# Altium footprint library Connector_Samtec_HLE_SMD.PcbLib: 290 footprints (part 22 of 24)
Each footprint in its own frame and in the unit in brackets; x right, y up, seen from the top. Pads: shape width x height; smd on the part's side, far side on the other; paste and mask are expansions set on the pad; w line width, h text height; cw(c..) or ccw(c..) is an arc to the next point about the centre after c.
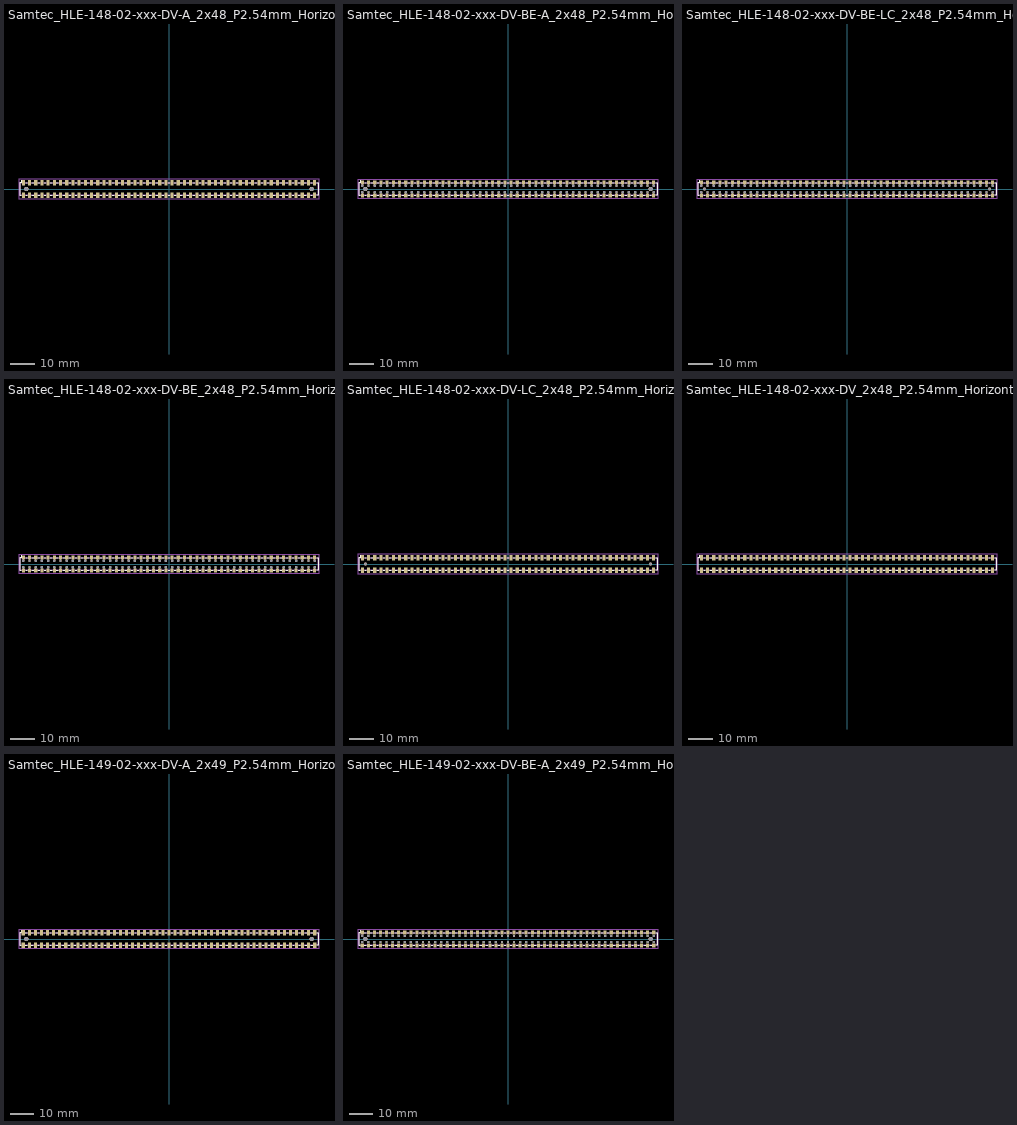
[diagram p21: the footprints below, top view; thin cyan lines are the x and y axes]

## Samtec_HLE-148-02-xxx-DV-A_2x48_P2.54mm_Horizontal [mm]
pads (98):
  rect 1.27x2.29 smd: 1(-59.69,2.525) 2(-59.69,-2.525) 3(-57.15,2.525) 4(-57.15,-2.525) 5(-54.61,2.525) 6(-54.61,-2.525) 7(-52.07,2.525) 8(-52.07,-2.525) 9(-49.53,2.525) 10(-49.53,-2.525) 11(-46.99,2.525) 12(-46.99,-2.525) 13(-44.45,2.525) 14(-44.45,-2.525) 15(-41.91,2.525) 16(-41.91,-2.525) 17(-39.37,2.525) 18(-39.37,-2.525) 19(-36.83,2.525) 20(-36.83,-2.525) 21(-34.29,2.525) 22(-34.29,-2.525) 23(-31.75,2.525) 24(-31.75,-2.525) 25(-29.21,2.525) 26(-29.21,-2.525) 27(-26.67,2.525) 28(-26.67,-2.525) 29(-24.13,2.525) 30(-24.13,-2.525) 31(-21.59,2.525) 32(-21.59,-2.525) 33(-19.05,2.525) 34(-19.05,-2.525) 35(-16.51,2.525) 36(-16.51,-2.525) 37(-13.97,2.525) 38(-13.97,-2.525) 39(-11.43,2.525) 40(-11.43,-2.525) 41(-8.89,2.525) 42(-8.89,-2.525) 43(-6.35,2.525) 44(-6.35,-2.525) 45(-3.81,2.525) 46(-3.81,-2.525) 47(-1.27,2.525) 48(-1.27,-2.525) 49(1.27,2.525) 50(1.27,-2.525) 51(3.81,2.525) 52(3.81,-2.525) 53(6.35,2.525) 54(6.35,-2.525) 55(8.89,2.525) 56(8.89,-2.525) 57(11.43,2.525) 58(11.43,-2.525) 59(13.97,2.525) 60(13.97,-2.525) 61(16.51,2.525) 62(16.51,-2.525) 63(19.05,2.525) 64(19.05,-2.525) 65(21.59,2.525) 66(21.59,-2.525) 67(24.13,2.525) 68(24.13,-2.525) 69(26.67,2.525) 70(26.67,-2.525) 71(29.21,2.525) 72(29.21,-2.525) 73(31.75,2.525) 74(31.75,-2.525) 75(34.29,2.525) 76(34.29,-2.525) 77(36.83,2.525) 78(36.83,-2.525) 79(39.37,2.525) 80(39.37,-2.525) 81(41.91,2.525) 82(41.91,-2.525) 83(44.45,2.525) 84(44.45,-2.525) 85(46.99,2.525) 86(46.99,-2.525) 87(49.53,2.525) 88(49.53,-2.525) 89(52.07,2.525) 90(52.07,-2.525) 91(54.61,2.525) 92(54.61,-2.525) 93(57.15,2.525) 94(57.15,-2.525) 95(59.69,2.525) 96(59.69,-2.525)
  round 1.78 hole 1.78: Un1(58.42,0) Un2(-58.42,0)
F.SilkS:
  lines w0.12: -60.585,-2.65 -61.07,-2.65 -61.07,2.65 -60.585,2.65 -60.585,3.67 ; -58.795,-2.65 -58.045,-2.65 ; -58.795,2.65 -58.045,2.65 ; -56.255,-2.65 -55.505,-2.65 ; -56.255,2.65 -55.505,2.65 ; -53.715,-2.65 -52.965,-2.65 ; -53.715,2.65 -52.965,2.65 ; -51.175,-2.65 -50.425,-2.65 ; -51.175,2.65 -50.425,2.65 ; -48.635,-2.65 -47.885,-2.65 ; -48.635,2.65 -47.885,2.65 ; -46.095,-2.65 -45.345,-2.65 ; -46.095,2.65 -45.345,2.65 ; -43.555,-2.65 -42.805,-2.65 ; -43.555,2.65 -42.805,2.65 ; -41.015,-2.65 -40.265,-2.65 ; -41.015,2.65 -40.265,2.65 ; -38.475,-2.65 -37.725,-2.65 ; -38.475,2.65 -37.725,2.65 ; -35.935,-2.65 -35.185,-2.65 ; -35.935,2.65 -35.185,2.65 ; -33.395,-2.65 -32.645,-2.65 ; -33.395,2.65 -32.645,2.65 ; -30.855,-2.65 -30.105,-2.65 ; -30.855,2.65 -30.105,2.65 ; -28.315,-2.65 -27.565,-2.65 ; -28.315,2.65 -27.565,2.65 ; -25.775,-2.65 -25.025,-2.65 ; -25.775,2.65 -25.025,2.65 ; -23.235,-2.65 -22.485,-2.65 ; -23.235,2.65 -22.485,2.65 ; -20.695,-2.65 -19.945,-2.65 ; -20.695,2.65 -19.945,2.65 ; -18.155,-2.65 -17.405,-2.65 ; -18.155,2.65 -17.405,2.65 ; -15.615,-2.65 -14.865,-2.65 ; -15.615,2.65 -14.865,2.65 ; -13.075,-2.65 -12.325,-2.65 ; -13.075,2.65 -12.325,2.65 ; -10.535,-2.65 -9.785,-2.65 ; -10.535,2.65 -9.785,2.65 ; -7.995,-2.65 -7.245,-2.65 ; -7.995,2.65 -7.245,2.65 ; -5.455,-2.65 -4.705,-2.65 ; -5.455,2.65 -4.705,2.65 ; -2.915,-2.65 -2.165,-2.65 ; -2.915,2.65 -2.165,2.65 ; -0.375,-2.65 0.375,-2.65 ; -0.375,2.65 0.375,2.65 ; 2.165,-2.65 2.915,-2.65 ; 2.165,2.65 2.915,2.65 ; 4.705,-2.65 5.455,-2.65 ; 4.705,2.65 5.455,2.65 ; 7.245,-2.65 7.995,-2.65 ; 7.245,2.65 7.995,2.65 ; 9.785,-2.65 10.535,-2.65 ; 9.785,2.65 10.535,2.65 ; 12.325,-2.65 13.075,-2.65 ; 12.325,2.65 13.075,2.65 ; 14.865,-2.65 15.615,-2.65 ; 14.865,2.65 15.615,2.65 ; 17.405,-2.65 18.155,-2.65 ; 17.405,2.65 18.155,2.65 ; 19.945,-2.65 20.695,-2.65 ; 19.945,2.65 20.695,2.65 ; 22.485,-2.65 23.235,-2.65 ; 22.485,2.65 23.235,2.65 ; 25.025,-2.65 25.775,-2.65 ; 25.025,2.65 25.775,2.65 ; 27.565,-2.65 28.315,-2.65 ; 27.565,2.65 28.315,2.65 ; 30.105,-2.65 30.855,-2.65 ; 30.105,2.65 30.855,2.65 ; 32.645,-2.65 33.395,-2.65 ; 32.645,2.65 33.395,2.65 ; 35.185,-2.65 35.935,-2.65 ; 35.185,2.65 35.935,2.65 ; 37.725,-2.65 38.475,-2.65 ; 37.725,2.65 38.475,2.65 ; 40.265,-2.65 41.015,-2.65 ; 40.265,2.65 41.015,2.65 ; 42.805,-2.65 43.555,-2.65 ; 42.805,2.65 43.555,2.65 ; 45.345,-2.65 46.095,-2.65 ; 45.345,2.65 46.095,2.65 ; 47.885,-2.65 48.635,-2.65 ; 47.885,2.65 48.635,2.65 ; 50.425,-2.65 51.175,-2.65 ; 50.425,2.65 51.175,2.65 ; 52.965,-2.65 53.715,-2.65 ; 52.965,2.65 53.715,2.65 ; 55.505,-2.65 56.255,-2.65 ; 55.505,2.65 56.255,2.65 ; 58.045,-2.65 58.795,-2.65 ; 58.045,2.65 58.795,2.65 ; 60.585,-2.65 61.07,-2.65 61.07,2.65 60.585,2.65
F.CrtYd:
  lines w0.05: -61.46,-4.17 61.46,-4.17 61.46,4.17 -61.46,4.17 -61.46,-4.17
F.Fab:
  lines w0.1: -60.19,2.54 -59.69,1.833 -59.19,2.54 ; -60.96,-2.54 -60.96,2.54 60.96,2.54 60.96,-2.54 -60.96,-2.54
  text "'.Designator'" at -4.047,-2.68 h1

## Samtec_HLE-148-02-xxx-DV-BE-A_2x48_P2.54mm_Horizontal [mm]
pads (194):
  rect 1.27x1.68 smd: 1(-59.69,2.72) 2(-59.69,-2.72) 3(-57.15,2.72) 4(-57.15,-2.72) 5(-54.61,2.72) 6(-54.61,-2.72) 7(-52.07,2.72) 8(-52.07,-2.72) 9(-49.53,2.72) 10(-49.53,-2.72) 11(-46.99,2.72) 12(-46.99,-2.72) 13(-44.45,2.72) 14(-44.45,-2.72) 15(-41.91,2.72) 16(-41.91,-2.72) 17(-39.37,2.72) 18(-39.37,-2.72) 19(-36.83,2.72) 20(-36.83,-2.72) 21(-34.29,2.72) 22(-34.29,-2.72) 23(-31.75,2.72) 24(-31.75,-2.72) 25(-29.21,2.72) 26(-29.21,-2.72) 27(-26.67,2.72) 28(-26.67,-2.72) 29(-24.13,2.72) 30(-24.13,-2.72) 31(-21.59,2.72) 32(-21.59,-2.72) 33(-19.05,2.72) 34(-19.05,-2.72) 35(-16.51,2.72) 36(-16.51,-2.72) 37(-13.97,2.72) 38(-13.97,-2.72) 39(-11.43,2.72) 40(-11.43,-2.72) 41(-8.89,2.72) 42(-8.89,-2.72) 43(-6.35,2.72) 44(-6.35,-2.72) 45(-3.81,2.72) 46(-3.81,-2.72) 47(-1.27,2.72) 48(-1.27,-2.72) 49(1.27,2.72) 50(1.27,-2.72) 51(3.81,2.72) 52(3.81,-2.72) 53(6.35,2.72) 54(6.35,-2.72) 55(8.89,2.72) 56(8.89,-2.72) 57(11.43,2.72) 58(11.43,-2.72) 59(13.97,2.72) 60(13.97,-2.72) 61(16.51,2.72) 62(16.51,-2.72) 63(19.05,2.72) 64(19.05,-2.72) 65(21.59,2.72) 66(21.59,-2.72) 67(24.13,2.72) 68(24.13,-2.72) 69(26.67,2.72) 70(26.67,-2.72) 71(29.21,2.72) 72(29.21,-2.72) 73(31.75,2.72) 74(31.75,-2.72) 75(34.29,2.72) 76(34.29,-2.72) 77(36.83,2.72) 78(36.83,-2.72) 79(39.37,2.72) 80(39.37,-2.72) 81(41.91,2.72) 82(41.91,-2.72) 83(44.45,2.72) 84(44.45,-2.72) 85(46.99,2.72) 86(46.99,-2.72) 87(49.53,2.72) 88(49.53,-2.72) 89(52.07,2.72) 90(52.07,-2.72) 91(54.61,2.72) 92(54.61,-2.72) 93(57.15,2.72) 94(57.15,-2.72) 95(59.69,2.72) 96(59.69,-2.72)
  round 0.97 hole 0.97: Un1(-24.13,1.27) Un2(-13.97,-1.27) Un3(-11.43,-1.27) Un4(-36.83,1.27) Un5(31.75,1.27) Un6(8.89,1.27) Un7(44.45,1.27) Un8(-31.75,-1.27) Un9(13.97,-1.27) Un10(31.75,-1.27) Un11(-8.89,-1.27) Un12(49.53,-1.27) Un13(16.51,-1.27) Un14(-44.45,1.27) Un15(41.91,-1.27) Un16(-24.13,-1.27) Un17(-8.89,1.27) Un18(24.13,-1.27) Un19(36.83,1.27) Un20(-16.51,1.27) Un21(-49.53,-1.27) Un22(13.97,1.27) Un23(8.89,-1.27) Un24(-19.05,1.27) Un25(-39.37,1.27) Un26(-59.69,-1.27) Un27(-41.91,-1.27) Un28(-52.07,1.27) Un29(44.45,-1.27) Un30(-46.99,-1.27) Un31(-46.99,1.27) Un32(59.69,-1.27) Un33(-3.81,-1.27) Un34(-3.81,1.27) Un35(11.43,-1.27) Un36(-31.75,1.27) Un37(3.81,-1.27) Un38(16.51,1.27) Un40(46.99,1.27) Un41(36.83,-1.27) Un42(59.69,1.27) Un43(-6.35,-1.27) Un44(49.53,1.27) Un45(-6.35,1.27) Un46(3.81,1.27) Un47(-49.53,1.27) Un48(29.21,-1.27) Un49(-41.91,1.27) Un50(-26.67,1.27) Un51(52.07,-1.27) Un52(21.59,1.27) Un53(57.15,1.27) Un54(-16.51,-1.27) Un55(-34.29,1.27) Un56(21.59,-1.27) Un57(-34.29,-1.27) Un58(26.67,-1.27) Un59(-59.69,1.27) Un60(19.05,-1.27) Un61(1.27,1.27) Un62(57.15,-1.27) Un63(-52.07,-1.27) Un64(-29.21,-1.27) Un65(-57.15,1.27) Un66(34.29,-1.27) Un67(-21.59,1.27) Un68(1.27,-1.27) Un69(-1.27,-1.27) Un70(54.61,1.27) Un71(-1.27,1.27) Un72(-44.45,-1.27) Un73(-19.05,-1.27) Un74(-29.21,1.27) Un75(39.37,1.27) Un76(-54.61,-1.27) Un77(-13.97,1.27) Un78(26.67,1.27) Un79(-26.67,-1.27) Un80(41.91,1.27) Un81(52.07,1.27) Un82(46.99,-1.27) Un83(29.21,1.27) Un84(6.35,-1.27) Un85(-36.83,-1.27) Un86(6.35,1.27) Un87(-39.37,-1.27) Un88(-57.15,-1.27) Un89(-21.59,-1.27) Un90(39.37,-1.27) Un92(-54.61,1.27) Un93(24.13,1.27) Un94(11.43,1.27) Un95(19.05,1.27) Un96(54.61,-1.27) Un97(34.29,1.27) Un98(-11.43,1.27)
  round 1.78 hole 1.78: Un39(-58.42,0) Un91(58.42,0)
F.SilkS:
  lines w0.12: -60.585,-2.65 -61.07,-2.65 -61.07,2.65 -60.585,2.65 -60.585,3.56 ; -58.795,-2.65 -58.045,-2.65 ; -58.795,2.65 -58.045,2.65 ; -56.255,-2.65 -55.505,-2.65 ; -56.255,2.65 -55.505,2.65 ; -53.715,-2.65 -52.965,-2.65 ; -53.715,2.65 -52.965,2.65 ; -51.175,-2.65 -50.425,-2.65 ; -51.175,2.65 -50.425,2.65 ; -48.635,-2.65 -47.885,-2.65 ; -48.635,2.65 -47.885,2.65 ; -46.095,-2.65 -45.345,-2.65 ; -46.095,2.65 -45.345,2.65 ; -43.555,-2.65 -42.805,-2.65 ; -43.555,2.65 -42.805,2.65 ; -41.015,-2.65 -40.265,-2.65 ; -41.015,2.65 -40.265,2.65 ; -38.475,-2.65 -37.725,-2.65 ; -38.475,2.65 -37.725,2.65 ; -35.935,-2.65 -35.185,-2.65 ; -35.935,2.65 -35.185,2.65 ; -33.395,-2.65 -32.645,-2.65 ; -33.395,2.65 -32.645,2.65 ; -30.855,-2.65 -30.105,-2.65 ; -30.855,2.65 -30.105,2.65 ; -28.315,-2.65 -27.565,-2.65 ; -28.315,2.65 -27.565,2.65 ; -25.775,-2.65 -25.025,-2.65 ; -25.775,2.65 -25.025,2.65 ; -23.235,-2.65 -22.485,-2.65 ; -23.235,2.65 -22.485,2.65 ; -20.695,-2.65 -19.945,-2.65 ; -20.695,2.65 -19.945,2.65 ; -18.155,-2.65 -17.405,-2.65 ; -18.155,2.65 -17.405,2.65 ; -15.615,-2.65 -14.865,-2.65 ; -15.615,2.65 -14.865,2.65 ; -13.075,-2.65 -12.325,-2.65 ; -13.075,2.65 -12.325,2.65 ; -10.535,-2.65 -9.785,-2.65 ; -10.535,2.65 -9.785,2.65 ; -7.995,-2.65 -7.245,-2.65 ; -7.995,2.65 -7.245,2.65 ; -5.455,-2.65 -4.705,-2.65 ; -5.455,2.65 -4.705,2.65 ; -2.915,-2.65 -2.165,-2.65 ; -2.915,2.65 -2.165,2.65 ; -0.375,-2.65 0.375,-2.65 ; -0.375,2.65 0.375,2.65 ; 2.165,-2.65 2.915,-2.65 ; 2.165,2.65 2.915,2.65 ; 4.705,-2.65 5.455,-2.65 ; 4.705,2.65 5.455,2.65 ; 7.245,-2.65 7.995,-2.65 ; 7.245,2.65 7.995,2.65 ; 9.785,-2.65 10.535,-2.65 ; 9.785,2.65 10.535,2.65 ; 12.325,-2.65 13.075,-2.65 ; 12.325,2.65 13.075,2.65 ; 14.865,-2.65 15.615,-2.65 ; 14.865,2.65 15.615,2.65 ; 17.405,-2.65 18.155,-2.65 ; 17.405,2.65 18.155,2.65 ; 19.945,-2.65 20.695,-2.65 ; 19.945,2.65 20.695,2.65 ; 22.485,-2.65 23.235,-2.65 ; 22.485,2.65 23.235,2.65 ; 25.025,-2.65 25.775,-2.65 ; 25.025,2.65 25.775,2.65 ; 27.565,-2.65 28.315,-2.65 ; 27.565,2.65 28.315,2.65 ; 30.105,-2.65 30.855,-2.65 ; 30.105,2.65 30.855,2.65 ; 32.645,-2.65 33.395,-2.65 ; 32.645,2.65 33.395,2.65 ; 35.185,-2.65 35.935,-2.65 ; 35.185,2.65 35.935,2.65 ; 37.725,-2.65 38.475,-2.65 ; 37.725,2.65 38.475,2.65 ; 40.265,-2.65 41.015,-2.65 ; 40.265,2.65 41.015,2.65 ; 42.805,-2.65 43.555,-2.65 ; 42.805,2.65 43.555,2.65 ; 45.345,-2.65 46.095,-2.65 ; 45.345,2.65 46.095,2.65 ; 47.885,-2.65 48.635,-2.65 ; 47.885,2.65 48.635,2.65 ; 50.425,-2.65 51.175,-2.65 ; 50.425,2.65 51.175,2.65 ; 52.965,-2.65 53.715,-2.65 ; 52.965,2.65 53.715,2.65 ; 55.505,-2.65 56.255,-2.65 ; 55.505,2.65 56.255,2.65 ; 58.045,-2.65 58.795,-2.65 ; 58.045,2.65 58.795,2.65 ; 60.585,-2.65 61.07,-2.65 61.07,2.65 60.585,2.65
F.CrtYd:
  lines w0.05: -61.46,-4.06 61.46,-4.06 61.46,4.06 -61.46,4.06 -61.46,-4.06
F.Fab:
  lines w0.1: -60.19,2.54 -59.69,1.833 -59.19,2.54 ; -60.96,-2.54 60.96,-2.54 60.96,2.54 -60.96,2.54 -60.96,-2.54
  text "'.Designator'" at -4.047,-2.68 h1

## Samtec_HLE-148-02-xxx-DV-BE-LC_2x48_P2.54mm_Horizontal [mm]
pads (194):
  rect 1.27x1.68 smd: 1(-59.69,2.72) 2(-59.69,-2.72) 3(-57.15,2.72) 4(-57.15,-2.72) 5(-54.61,2.72) 6(-54.61,-2.72) 7(-52.07,2.72) 8(-52.07,-2.72) 9(-49.53,2.72) 10(-49.53,-2.72) 11(-46.99,2.72) 12(-46.99,-2.72) 13(-44.45,2.72) 14(-44.45,-2.72) 15(-41.91,2.72) 16(-41.91,-2.72) 17(-39.37,2.72) 18(-39.37,-2.72) 19(-36.83,2.72) 20(-36.83,-2.72) 21(-34.29,2.72) 22(-34.29,-2.72) 23(-31.75,2.72) 24(-31.75,-2.72) 25(-29.21,2.72) 26(-29.21,-2.72) 27(-26.67,2.72) 28(-26.67,-2.72) 29(-24.13,2.72) 30(-24.13,-2.72) 31(-21.59,2.72) 32(-21.59,-2.72) 33(-19.05,2.72) 34(-19.05,-2.72) 35(-16.51,2.72) 36(-16.51,-2.72) 37(-13.97,2.72) 38(-13.97,-2.72) 39(-11.43,2.72) 40(-11.43,-2.72) 41(-8.89,2.72) 42(-8.89,-2.72) 43(-6.35,2.72) 44(-6.35,-2.72) 45(-3.81,2.72) 46(-3.81,-2.72) 47(-1.27,2.72) 48(-1.27,-2.72) 49(1.27,2.72) 50(1.27,-2.72) 51(3.81,2.72) 52(3.81,-2.72) 53(6.35,2.72) 54(6.35,-2.72) 55(8.89,2.72) 56(8.89,-2.72) 57(11.43,2.72) 58(11.43,-2.72) 59(13.97,2.72) 60(13.97,-2.72) 61(16.51,2.72) 62(16.51,-2.72) 63(19.05,2.72) 64(19.05,-2.72) 65(21.59,2.72) 66(21.59,-2.72) 67(24.13,2.72) 68(24.13,-2.72) 69(26.67,2.72) 70(26.67,-2.72) 71(29.21,2.72) 72(29.21,-2.72) 73(31.75,2.72) 74(31.75,-2.72) 75(34.29,2.72) 76(34.29,-2.72) 77(36.83,2.72) 78(36.83,-2.72) 79(39.37,2.72) 80(39.37,-2.72) 81(41.91,2.72) 82(41.91,-2.72) 83(44.45,2.72) 84(44.45,-2.72) 85(46.99,2.72) 86(46.99,-2.72) 87(49.53,2.72) 88(49.53,-2.72) 89(52.07,2.72) 90(52.07,-2.72) 91(54.61,2.72) 92(54.61,-2.72) 93(57.15,2.72) 94(57.15,-2.72) 95(59.69,2.72) 96(59.69,-2.72)
  round 0.97 hole 0.97: Un1(8.89,1.27) Un2(34.29,1.27) Un3(-31.75,1.27) Un4(21.59,-1.27) Un5(11.43,1.27) Un6(-13.97,1.27) Un7(59.69,1.27) Un8(-59.69,-1.27) Un9(16.51,-1.27) Un10(-8.89,-1.27) Un11(-39.37,-1.27) Un12(-54.61,1.27) Un13(3.81,-1.27) Un14(49.53,-1.27) Un15(-39.37,1.27) Un17(6.35,-1.27) Un18(-54.61,-1.27) Un19(24.13,1.27) Un20(-52.07,1.27) Un21(-44.45,-1.27) Un22(44.45,-1.27) Un23(31.75,-1.27) Un24(1.27,1.27) Un25(31.75,1.27) Un26(41.91,-1.27) Un27(-6.35,-1.27) Un28(-29.21,1.27) Un29(-3.81,-1.27) Un30(6.35,1.27) Un31(8.89,-1.27) Un32(57.15,1.27) Un33(46.99,-1.27) Un34(-46.99,1.27) Un35(44.45,1.27) Un36(29.21,1.27) Un37(21.59,1.27) Un38(-57.15,-1.27) Un39(24.13,-1.27) Un40(-21.59,-1.27) Un41(-59.69,1.27) Un42(49.53,1.27) Un43(-3.81,1.27) Un44(-34.29,1.27) Un45(-16.51,-1.27) Un46(26.67,-1.27) Un47(-44.45,1.27) Un48(26.67,1.27) Un49(-13.97,-1.27) Un50(52.07,-1.27) Un51(-1.27,1.27) Un52(-26.67,-1.27) Un53(-36.83,-1.27) Un54(-52.07,-1.27) Un55(-49.53,1.27) Un56(-16.51,1.27) Un57(59.69,-1.27) Un58(19.05,-1.27) Un59(-11.43,1.27) Un60(54.61,1.27) Un61(41.91,1.27) Un62(-8.89,1.27) Un63(-21.59,1.27) Un64(-46.99,-1.27) Un65(34.29,-1.27) Un66(13.97,-1.27) Un67(-11.43,-1.27) Un68(16.51,1.27) Un69(-26.67,1.27) Un70(52.07,1.27) Un71(-19.05,-1.27) Un72(-31.75,-1.27) Un73(46.99,1.27) Un74(36.83,1.27) Un75(29.21,-1.27) Un76(1.27,-1.27) Un77(-1.27,-1.27) Un79(3.81,1.27) Un80(-29.21,-1.27) Un81(-34.29,-1.27) Un82(19.05,1.27) Un83(54.61,-1.27) Un84(-6.35,1.27) Un85(-19.05,1.27) Un86(36.83,-1.27) Un87(57.15,-1.27) Un88(-24.13,1.27) Un89(13.97,1.27) Un90(39.37,1.27) Un91(-41.91,1.27) Un92(-41.91,-1.27) Un93(-57.15,1.27) Un94(39.37,-1.27) Un95(-36.83,1.27) Un96(11.43,-1.27) Un97(-24.13,-1.27) Un98(-49.53,-1.27)
  round 1.19 hole 1.19: Un16(-58.42,0) Un78(58.42,0)
F.SilkS:
  lines w0.12: -60.585,-2.65 -61.07,-2.65 -61.07,2.65 -60.585,2.65 -60.585,3.56 ; -58.795,-2.65 -58.045,-2.65 ; -58.795,2.65 -58.045,2.65 ; -56.255,-2.65 -55.505,-2.65 ; -56.255,2.65 -55.505,2.65 ; -53.715,-2.65 -52.965,-2.65 ; -53.715,2.65 -52.965,2.65 ; -51.175,-2.65 -50.425,-2.65 ; -51.175,2.65 -50.425,2.65 ; -48.635,-2.65 -47.885,-2.65 ; -48.635,2.65 -47.885,2.65 ; -46.095,-2.65 -45.345,-2.65 ; -46.095,2.65 -45.345,2.65 ; -43.555,-2.65 -42.805,-2.65 ; -43.555,2.65 -42.805,2.65 ; -41.015,-2.65 -40.265,-2.65 ; -41.015,2.65 -40.265,2.65 ; -38.475,-2.65 -37.725,-2.65 ; -38.475,2.65 -37.725,2.65 ; -35.935,-2.65 -35.185,-2.65 ; -35.935,2.65 -35.185,2.65 ; -33.395,-2.65 -32.645,-2.65 ; -33.395,2.65 -32.645,2.65 ; -30.855,-2.65 -30.105,-2.65 ; -30.855,2.65 -30.105,2.65 ; -28.315,-2.65 -27.565,-2.65 ; -28.315,2.65 -27.565,2.65 ; -25.775,-2.65 -25.025,-2.65 ; -25.775,2.65 -25.025,2.65 ; -23.235,-2.65 -22.485,-2.65 ; -23.235,2.65 -22.485,2.65 ; -20.695,-2.65 -19.945,-2.65 ; -20.695,2.65 -19.945,2.65 ; -18.155,-2.65 -17.405,-2.65 ; -18.155,2.65 -17.405,2.65 ; -15.615,-2.65 -14.865,-2.65 ; -15.615,2.65 -14.865,2.65 ; -13.075,-2.65 -12.325,-2.65 ; -13.075,2.65 -12.325,2.65 ; -10.535,-2.65 -9.785,-2.65 ; -10.535,2.65 -9.785,2.65 ; -7.995,-2.65 -7.245,-2.65 ; -7.995,2.65 -7.245,2.65 ; -5.455,-2.65 -4.705,-2.65 ; -5.455,2.65 -4.705,2.65 ; -2.915,-2.65 -2.165,-2.65 ; -2.915,2.65 -2.165,2.65 ; -0.375,-2.65 0.375,-2.65 ; -0.375,2.65 0.375,2.65 ; 2.165,-2.65 2.915,-2.65 ; 2.165,2.65 2.915,2.65 ; 4.705,-2.65 5.455,-2.65 ; 4.705,2.65 5.455,2.65 ; 7.245,-2.65 7.995,-2.65 ; 7.245,2.65 7.995,2.65 ; 9.785,-2.65 10.535,-2.65 ; 9.785,2.65 10.535,2.65 ; 12.325,-2.65 13.075,-2.65 ; 12.325,2.65 13.075,2.65 ; 14.865,-2.65 15.615,-2.65 ; 14.865,2.65 15.615,2.65 ; 17.405,-2.65 18.155,-2.65 ; 17.405,2.65 18.155,2.65 ; 19.945,-2.65 20.695,-2.65 ; 19.945,2.65 20.695,2.65 ; 22.485,-2.65 23.235,-2.65 ; 22.485,2.65 23.235,2.65 ; 25.025,-2.65 25.775,-2.65 ; 25.025,2.65 25.775,2.65 ; 27.565,-2.65 28.315,-2.65 ; 27.565,2.65 28.315,2.65 ; 30.105,-2.65 30.855,-2.65 ; 30.105,2.65 30.855,2.65 ; 32.645,-2.65 33.395,-2.65 ; 32.645,2.65 33.395,2.65 ; 35.185,-2.65 35.935,-2.65 ; 35.185,2.65 35.935,2.65 ; 37.725,-2.65 38.475,-2.65 ; 37.725,2.65 38.475,2.65 ; 40.265,-2.65 41.015,-2.65 ; 40.265,2.65 41.015,2.65 ; 42.805,-2.65 43.555,-2.65 ; 42.805,2.65 43.555,2.65 ; 45.345,-2.65 46.095,-2.65 ; 45.345,2.65 46.095,2.65 ; 47.885,-2.65 48.635,-2.65 ; 47.885,2.65 48.635,2.65 ; 50.425,-2.65 51.175,-2.65 ; 50.425,2.65 51.175,2.65 ; 52.965,-2.65 53.715,-2.65 ; 52.965,2.65 53.715,2.65 ; 55.505,-2.65 56.255,-2.65 ; 55.505,2.65 56.255,2.65 ; 58.045,-2.65 58.795,-2.65 ; 58.045,2.65 58.795,2.65 ; 60.585,-2.65 61.07,-2.65 61.07,2.65 60.585,2.65
F.CrtYd:
  lines w0.05: -61.46,-4.06 -61.46,4.06 61.46,4.06 61.46,-4.06 -61.46,-4.06
F.Fab:
  lines w0.1: -60.19,2.54 -59.69,1.833 -59.19,2.54 ; -60.96,-2.54 60.96,-2.54 60.96,2.54 -60.96,2.54 -60.96,-2.54
  text "'.Designator'" at -4.047,-2.68 h1

## Samtec_HLE-148-02-xxx-DV-BE_2x48_P2.54mm_Horizontal [mm]
pads (192):
  rect 1.27x1.68 smd: 1(-59.69,2.72) 2(-59.69,-2.72) 3(-57.15,2.72) 4(-57.15,-2.72) 5(-54.61,2.72) 6(-54.61,-2.72) 7(-52.07,2.72) 8(-52.07,-2.72) 9(-49.53,2.72) 10(-49.53,-2.72) 11(-46.99,2.72) 12(-46.99,-2.72) 13(-44.45,2.72) 14(-44.45,-2.72) 15(-41.91,2.72) 16(-41.91,-2.72) 17(-39.37,2.72) 18(-39.37,-2.72) 19(-36.83,2.72) 20(-36.83,-2.72) 21(-34.29,2.72) 22(-34.29,-2.72) 23(-31.75,2.72) 24(-31.75,-2.72) 25(-29.21,2.72) 26(-29.21,-2.72) 27(-26.67,2.72) 28(-26.67,-2.72) 29(-24.13,2.72) 30(-24.13,-2.72) 31(-21.59,2.72) 32(-21.59,-2.72) 33(-19.05,2.72) 34(-19.05,-2.72) 35(-16.51,2.72) 36(-16.51,-2.72) 37(-13.97,2.72) 38(-13.97,-2.72) 39(-11.43,2.72) 40(-11.43,-2.72) 41(-8.89,2.72) 42(-8.89,-2.72) 43(-6.35,2.72) 44(-6.35,-2.72) 45(-3.81,2.72) 46(-3.81,-2.72) 47(-1.27,2.72) 48(-1.27,-2.72) 49(1.27,2.72) 50(1.27,-2.72) 51(3.81,2.72) 52(3.81,-2.72) 53(6.35,2.72) 54(6.35,-2.72) 55(8.89,2.72) 56(8.89,-2.72) 57(11.43,2.72) 58(11.43,-2.72) 59(13.97,2.72) 60(13.97,-2.72) 61(16.51,2.72) 62(16.51,-2.72) 63(19.05,2.72) 64(19.05,-2.72) 65(21.59,2.72) 66(21.59,-2.72) 67(24.13,2.72) 68(24.13,-2.72) 69(26.67,2.72) 70(26.67,-2.72) 71(29.21,2.72) 72(29.21,-2.72) 73(31.75,2.72) 74(31.75,-2.72) 75(34.29,2.72) 76(34.29,-2.72) 77(36.83,2.72) 78(36.83,-2.72) 79(39.37,2.72) 80(39.37,-2.72) 81(41.91,2.72) 82(41.91,-2.72) 83(44.45,2.72) 84(44.45,-2.72) 85(46.99,2.72) 86(46.99,-2.72) 87(49.53,2.72) 88(49.53,-2.72) 89(52.07,2.72) 90(52.07,-2.72) 91(54.61,2.72) 92(54.61,-2.72) 93(57.15,2.72) 94(57.15,-2.72) 95(59.69,2.72) 96(59.69,-2.72)
  round 0.97 hole 0.97: Un1(54.61,1.27) Un2(36.83,1.27) Un3(8.89,1.27) Un4(-8.89,-1.27) Un5(-6.35,1.27) Un6(-57.15,1.27) Un7(-46.99,-1.27) Un8(-52.07,1.27) Un9(-24.13,-1.27) Un10(41.91,-1.27) Un11(-49.53,1.27) Un12(16.51,1.27) Un13(-36.83,1.27) Un14(59.69,1.27) Un15(24.13,1.27) Un16(52.07,-1.27) Un17(-29.21,1.27) Un18(57.15,1.27) Un19(-31.75,1.27) Un20(-16.51,-1.27) Un21(11.43,1.27) Un22(21.59,-1.27) Un23(-21.59,1.27) Un24(-52.07,-1.27) Un25(1.27,1.27) Un26(-36.83,-1.27) Un27(-3.81,1.27) Un28(-21.59,-1.27) Un29(6.35,-1.27) Un30(-11.43,1.27) Un31(26.67,-1.27) Un32(-57.15,-1.27) Un33(-54.61,1.27) Un34(19.05,1.27) Un35(44.45,1.27) Un36(-13.97,-1.27) Un37(-44.45,1.27) Un38(-31.75,-1.27) Un39(-59.69,1.27) Un40(-41.91,-1.27) Un41(46.99,1.27) Un42(-34.29,-1.27) Un43(-39.37,-1.27) Un44(-41.91,1.27) Un45(29.21,1.27) Un46(-24.13,1.27) Un47(19.05,-1.27) Un48(-44.45,-1.27) Un49(-54.61,-1.27) Un50(34.29,1.27) Un51(49.53,1.27) Un52(49.53,-1.27) Un53(41.91,1.27) Un54(16.51,-1.27) Un55(39.37,-1.27) Un56(24.13,-1.27) Un57(52.07,1.27) Un58(8.89,-1.27) Un59(29.21,-1.27) Un60(26.67,1.27) Un61(-46.99,1.27) Un62(-39.37,1.27) Un63(11.43,-1.27) Un64(13.97,1.27) Un65(6.35,1.27) Un66(13.97,-1.27) Un67(31.75,1.27) Un68(-19.05,-1.27) Un69(54.61,-1.27) Un70(21.59,1.27) Un71(3.81,-1.27) Un72(1.27,-1.27) Un73(-26.67,1.27) Un74(-6.35,-1.27) Un75(59.69,-1.27) Un76(-3.81,-1.27) Un77(57.15,-1.27) Un78(-11.43,-1.27) Un79(39.37,1.27) Un80(-1.27,-1.27) Un81(-49.53,-1.27) Un82(-1.27,1.27) Un83(-34.29,1.27) Un84(3.81,1.27) Un85(-16.51,1.27) Un86(-19.05,1.27) Un87(36.83,-1.27) Un88(-13.97,1.27) Un89(31.75,-1.27) Un90(-8.89,1.27) Un91(-26.67,-1.27) Un92(34.29,-1.27) Un93(44.45,-1.27) Un94(-59.69,-1.27) Un95(-29.21,-1.27) Un96(46.99,-1.27)
F.SilkS:
  lines w0.12: -60.585,-2.65 -61.07,-2.65 -61.07,2.65 -60.585,2.65 -60.585,3.56 ; -58.795,-2.65 -58.045,-2.65 ; -58.795,2.65 -58.045,2.65 ; -56.255,-2.65 -55.505,-2.65 ; -56.255,2.65 -55.505,2.65 ; -53.715,-2.65 -52.965,-2.65 ; -53.715,2.65 -52.965,2.65 ; -51.175,-2.65 -50.425,-2.65 ; -51.175,2.65 -50.425,2.65 ; -48.635,-2.65 -47.885,-2.65 ; -48.635,2.65 -47.885,2.65 ; -46.095,-2.65 -45.345,-2.65 ; -46.095,2.65 -45.345,2.65 ; -43.555,-2.65 -42.805,-2.65 ; -43.555,2.65 -42.805,2.65 ; -41.015,-2.65 -40.265,-2.65 ; -41.015,2.65 -40.265,2.65 ; -38.475,-2.65 -37.725,-2.65 ; -38.475,2.65 -37.725,2.65 ; -35.935,-2.65 -35.185,-2.65 ; -35.935,2.65 -35.185,2.65 ; -33.395,-2.65 -32.645,-2.65 ; -33.395,2.65 -32.645,2.65 ; -30.855,-2.65 -30.105,-2.65 ; -30.855,2.65 -30.105,2.65 ; -28.315,-2.65 -27.565,-2.65 ; -28.315,2.65 -27.565,2.65 ; -25.775,-2.65 -25.025,-2.65 ; -25.775,2.65 -25.025,2.65 ; -23.235,-2.65 -22.485,-2.65 ; -23.235,2.65 -22.485,2.65 ; -20.695,-2.65 -19.945,-2.65 ; -20.695,2.65 -19.945,2.65 ; -18.155,-2.65 -17.405,-2.65 ; -18.155,2.65 -17.405,2.65 ; -15.615,-2.65 -14.865,-2.65 ; -15.615,2.65 -14.865,2.65 ; -13.075,-2.65 -12.325,-2.65 ; -13.075,2.65 -12.325,2.65 ; -10.535,-2.65 -9.785,-2.65 ; -10.535,2.65 -9.785,2.65 ; -7.995,-2.65 -7.245,-2.65 ; -7.995,2.65 -7.245,2.65 ; -5.455,-2.65 -4.705,-2.65 ; -5.455,2.65 -4.705,2.65 ; -2.915,-2.65 -2.165,-2.65 ; -2.915,2.65 -2.165,2.65 ; -0.375,-2.65 0.375,-2.65 ; -0.375,2.65 0.375,2.65 ; 2.165,-2.65 2.915,-2.65 ; 2.165,2.65 2.915,2.65 ; 4.705,-2.65 5.455,-2.65 ; 4.705,2.65 5.455,2.65 ; 7.245,-2.65 7.995,-2.65 ; 7.245,2.65 7.995,2.65 ; 9.785,-2.65 10.535,-2.65 ; 9.785,2.65 10.535,2.65 ; 12.325,-2.65 13.075,-2.65 ; 12.325,2.65 13.075,2.65 ; 14.865,-2.65 15.615,-2.65 ; 14.865,2.65 15.615,2.65 ; 17.405,-2.65 18.155,-2.65 ; 17.405,2.65 18.155,2.65 ; 19.945,-2.65 20.695,-2.65 ; 19.945,2.65 20.695,2.65 ; 22.485,-2.65 23.235,-2.65 ; 22.485,2.65 23.235,2.65 ; 25.025,-2.65 25.775,-2.65 ; 25.025,2.65 25.775,2.65 ; 27.565,-2.65 28.315,-2.65 ; 27.565,2.65 28.315,2.65 ; 30.105,-2.65 30.855,-2.65 ; 30.105,2.65 30.855,2.65 ; 32.645,-2.65 33.395,-2.65 ; 32.645,2.65 33.395,2.65 ; 35.185,-2.65 35.935,-2.65 ; 35.185,2.65 35.935,2.65 ; 37.725,-2.65 38.475,-2.65 ; 37.725,2.65 38.475,2.65 ; 40.265,-2.65 41.015,-2.65 ; 40.265,2.65 41.015,2.65 ; 42.805,-2.65 43.555,-2.65 ; 42.805,2.65 43.555,2.65 ; 45.345,-2.65 46.095,-2.65 ; 45.345,2.65 46.095,2.65 ; 47.885,-2.65 48.635,-2.65 ; 47.885,2.65 48.635,2.65 ; 50.425,-2.65 51.175,-2.65 ; 50.425,2.65 51.175,2.65 ; 52.965,-2.65 53.715,-2.65 ; 52.965,2.65 53.715,2.65 ; 55.505,-2.65 56.255,-2.65 ; 55.505,2.65 56.255,2.65 ; 58.045,-2.65 58.795,-2.65 ; 58.045,2.65 58.795,2.65 ; 60.585,-2.65 61.07,-2.65 61.07,2.65 60.585,2.65